# Altium footprint library common.PcbLib: 552 footprints (part 25 of 35)
Each footprint in its own frame and in the unit in brackets; x right, y up, seen from the top. Pads: shape width x height; smd on the part's side, far side on the other; paste and mask are expansions set on the pad; w line width, h text height; cw(c..) or ccw(c..) is an arc to the next point about the centre after c.
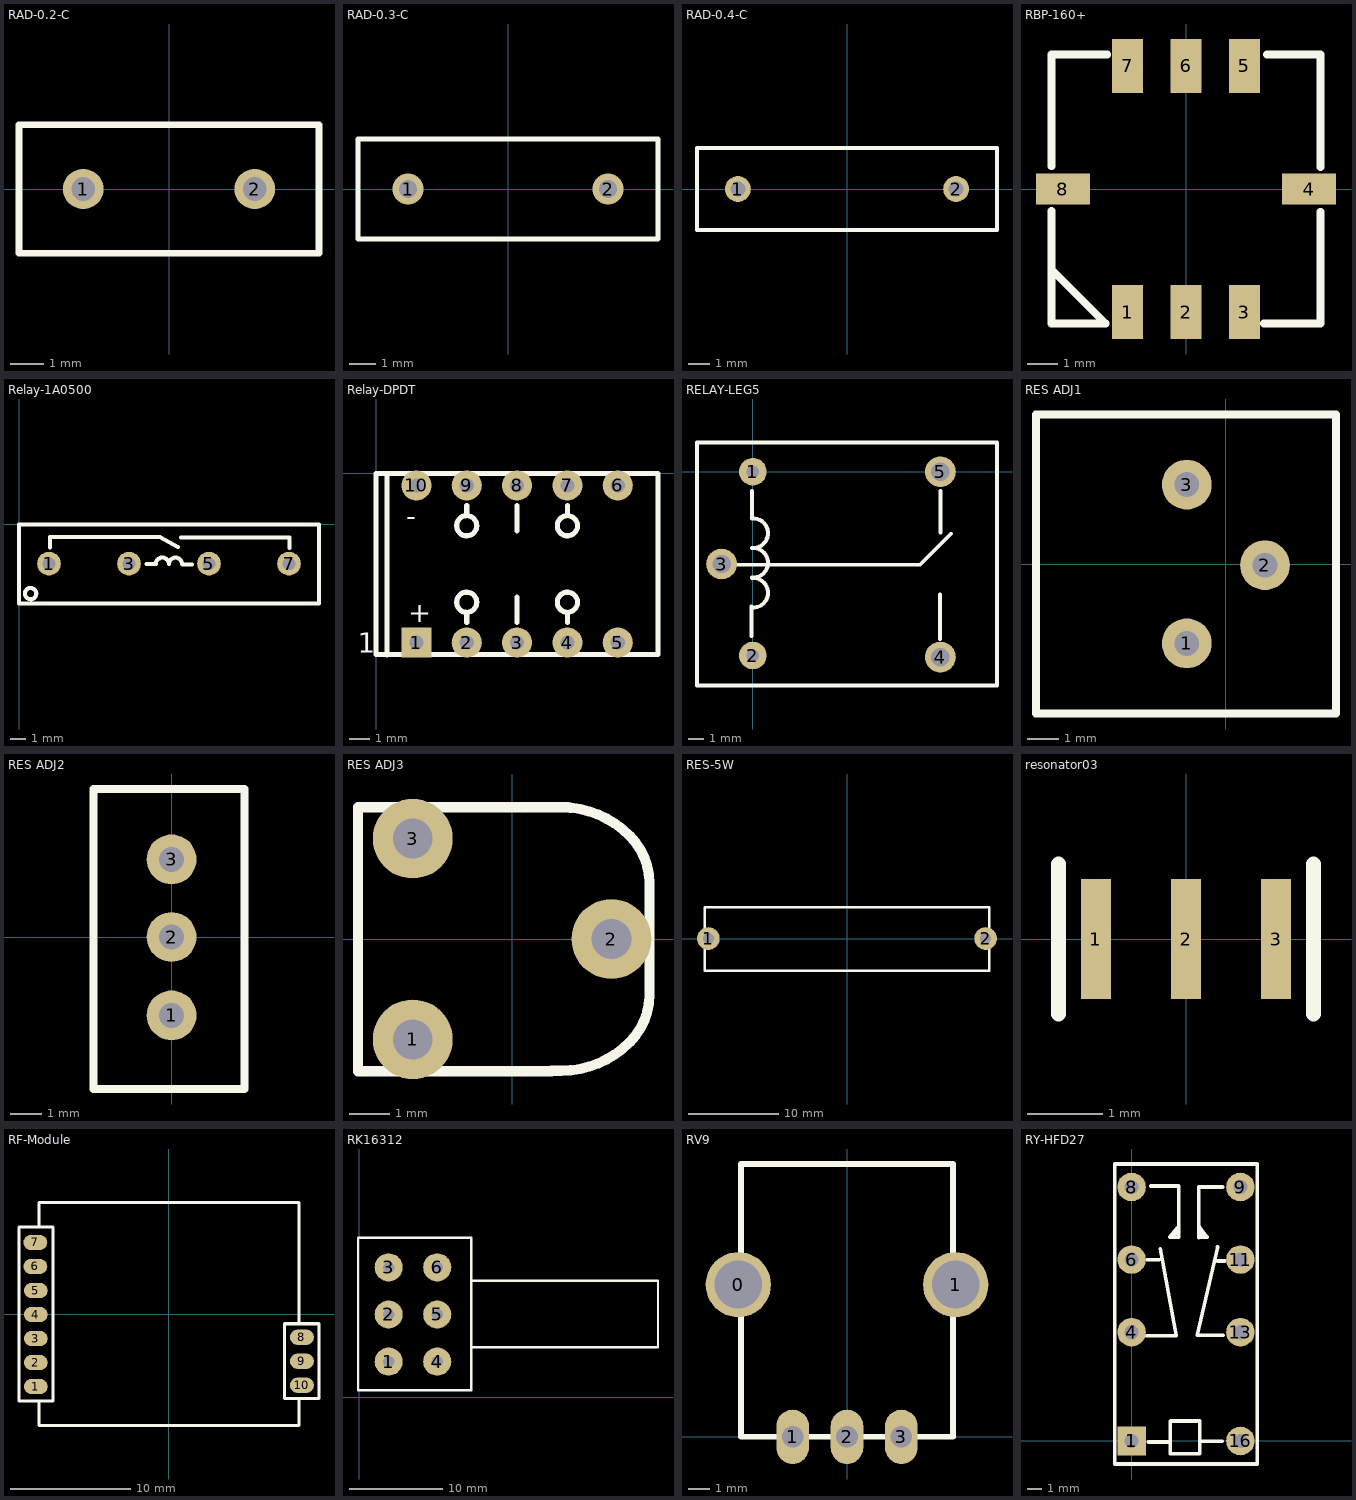
[diagram p24: the footprints below, top view; thin cyan lines are the x and y axes]

## RAD-0.2-C [mm] "Radial Cap, Thru-Hole; 2 Leads; 0.2 in Pin Spacing"
pads (2):
  round 1.2 hole 0.7: 1(-2.54,0) 2(2.54,0)
Top Overlay:
  lines w0.2: -4.445,-1.905 -4.445,1.905 4.445,1.905 4.445,-1.905 -4.445,-1.905
3D body: height 6.14, standoff -1.48, extent -2.794,-1.016 2.794,1.27

## RAD-0.3-C [mm] "Radial Cap, Thru-Hole; 2 Leads; 0.3 in Pin Spacing"
height 6
pads (2):
  round 1.2 hole 0.7: 1(-3.81,0) 2(3.81,0)
Top Overlay:
  lines w0.2: -5.715,-1.905 5.715,-1.905 5.715,1.905 -5.715,1.905 -5.715,-1.905
3D body: height 14.62, standoff -5.79, extent -6.377,-2.921 6.123,2.979

## RAD-0.4-C [mm] "Radial Cap, Thru-Hole; 2 Leads; 0.4 in Pin Spacing"
pads (2):
  round 1.2 hole 0.7: 1(-5.08,0) 2(5.08,0)
Top Overlay:
  lines w0.2: -6.985,-1.905 6.985,-1.905 6.985,1.905 -6.985,1.905 -6.985,-1.905
3D body: height 16.47, standoff -3.94, extent -6.25,-2.979 6.25,2.921

## RBP-160+ [mm] "IF SAW FILTER"
height 5.33
pads (8):
  rect 1.02x1.78 smd: 1(-1.93,-4.065) 2(0,-4.065) 3(1.93,-4.065) 5(1.93,4.065) 6(0,4.065) 7(-1.93,4.065)
  rect 1.78x1.02 smd: 4(4.065,0) 8(-4.065,0)
Top Overlay:
  lines w0.254: -4.445,-4.191 -4.445,-0.725 ; -4.445,-3.275 -4.445,-4.445 -2.65,-4.445 -4.445,-2.65 -4.445,-2.325 ; -4.445,0.75 -4.445,4.445 -2.6,4.445 ; 2.575,-4.445 4.445,-4.445 4.445,-0.75 ; 2.675,4.445 4.191,4.445 4.445,4.445 ; 3.35,4.445 4.445,4.445 ; 4.445,0.725 4.445,4.445
3D body: height 2.54, standoff 0, extent -4.455,-4.455 4.455,4.455

## Relay-1A0500 [mm]
pads (4):
  round 1.5 hole 0.8: 1(1.905,-2.489) 3(6.985,-2.489) 5(12.065,-2.489) 7(17.145,-2.489)
Top Overlay:
  circle w0.254: c0.737,-4.394 r0.359
  lines w0.254: 1.981,-1.473 1.981,-0.813 8.966,-0.813 10.109,-1.448 ; 8.103,-2.515 8.687,-2.515 cw(c9.093,-2.515) 9.093,-2.108 cw(c9.093,-2.54) 9.524,-2.516 ; 9.526,-2.515 cw(c9.932,-2.515) 9.932,-2.108 cw(c9.932,-2.54) 10.363,-2.516 ; 10.287,-0.838 17.17,-0.838 17.17,-1.499 ; 10.389,-2.54 10.973,-2.54 ; 0,-5.029 19.05,-5.029 19.05,0 0,0 0,-5.029
3D body: height 8.15, standoff -3.15, extent -0.374,-5.054 19.426,0.026

## Relay-DPDT [mm]
pads (10):
  rect 1.5x1.5 hole 0.7: 1(2,-8.4)
  round 1.5 hole 0.7: 2(4.5,-8.4) 3(7,-8.4) 4(9.5,-8.4) 5(12,-8.4) 6(12,-0.6) 7(9.5,-0.6) 8(7,-0.6) 9(4.5,-0.6) 10(2,-0.6)
Top Overlay:
  circle w0.254: c4.5,-2.6 r0.5
  circle w0.254: c9.5,-2.6 r0.5
  circle w0.254: c4.5,-6.4 r0.5
  circle w0.254: c9.5,-6.4 r0.5
  lines w0.254: 0.533,-9.017 0.533,-0.025 ; 4.5,-7.4 4.5,-6.9 ; 4.5,-2.1 4.5,-1.6 ; 7,-7.4 7,-6.15 ; 7,-2.85 7,-1.6 ; 9.5,-7.4 9.5,-6.9 ; 9.5,-2.1 9.5,-1.6 ; 0,-9 0,0 14,0 14,-9 0,-9
  text "+" at 1.6,-7.4 h1
  text "-" at 1.5,-2.6 h1
  text "1" at -0.9,-8.9 h1
3D body: height 5, standoff 0, extent 0,-9 14,0

## RELAY-LEG5 [mm]
pads (5):
  round 1.8 hole 0.8: 1(0,0) 2(0,-11.965)
  round 2 hole 1.2: 3(-2.032,-6.007) 4(12.217,-12.065) 5(12.217,0)
Top Overlay:
  lines w0.254: -0.965,-6.058 10.897,-6.058 12.916,-4.039 ; -0.076,-10.706 -0.076,-8.776 ; -0.051,-8.852 ccw(c0.021,-7.887) -0.04,-6.922 ; -0.051,-6.896 ccw(c0.021,-5.932) -0.04,-4.966 ; -0.051,-4.966 ccw(c0.021,-4.001) -0.04,-3.036 -0.04,-1.243 ; 12.192,-10.884 12.192,-7.988 ; 12.217,-3.95 12.217,-1.257 ; -3.632,-13.919 15.9,-13.919 15.9,1.905 -3.632,1.905 -3.632,-13.919
3D body: height 15.3, standoff -5, extent -3.403,-13.906 15.697,1.594

## RES ADJ1 [mm]
pads (3):
  round 1.6 hole 0.8: 1(-1.257,-2.553) 2(1.257,-0.038) 3(-1.257,2.553)
Top Overlay:
  lines w0.254: -6.109,-4.813 -6.109,4.813 3.543,4.813 3.543,-4.813 -6.109,-4.813
3D body: height 5, standoff -4.83, extent -6.073,-4.793 3.457,4.737

## RES ADJ2 [mm]
pads (3):
  round 1.6 hole 0.8: 1(0,-2.515) 2(0,0) 3(0,2.489)
Top Overlay:
  lines w0.254: -2.502,-4.877 -2.502,4.75 2.337,4.75 2.337,-4.877 -2.502,-4.877
3D body: height 9.53, standoff -5, extent -2.464,-4.828 2.366,4.701

## RES ADJ3 [mm]
pads (3):
  round 2 hole 1: 1(-2.489,-2.515) 2(2.489,0) 3(-2.489,2.515)
Top Overlay:
  lines w0.254: 0.991,-3.315 -3.861,-3.315 -3.861,3.302 1.397,3.302 ; 0.991,-3.302 1.229,-3.302 ccw(c1.229,-0.874) 2.946,-2.591 ccw(c1.751,-1.395) 3.442,-1.395 3.442,-1.372 ; 0.991,3.302 1.229,3.302 cw(c1.229,0.874) 2.946,2.591 cw(c1.751,1.395) 3.442,1.395 3.442,1.372 ; 3.442,-1.384 3.442,1.384
3D body: height 7.5, standoff -2, extent -3.754,-3.201 3.246,3.199

## RES-5W [mm]
pads (2):
  round 2.5 hole 1.2: 1(-15.291,0) 2(15.291,0)
Top Overlay:
  lines w0.254: -15.697,-3.556 -15.697,3.454 15.697,3.454 15.697,-3.556 -15.697,-3.556
3D body: height 4.35, standoff -6.85, extent -15.64,-3.52 15.64,3.48

## resonator03 [mm]
height 1.35
pads (3):
  rect 0.4x1.6 smd: 1(-1.2,0) 2(0,0) 3(1.2,0)
Top Overlay:
  lines w0.203: -1.7,-1 -1.7,1 ; 1.7,-1 1.7,1
3D body: height 1.02, standoff -0.09, extent -1.6,-0.6 1.6,0.7

## RF-Module [mm]
pads (10):
  oval 2x1.27 smd: 1(-11.067,-6.005) 2(-11.067,-4.005) 3(-11.067,-2.005) 4(-11.067,-0.004) 5(-11.067,1.996) 6(-11.107,4.005) 7(-11.107,6.005) 8(11.107,-1.897) 9(11.107,-3.897) 10(11.107,-5.897)
Top Overlay:
  lines w0.254: -10.813,-7.326 -10.813,-9.231 10.853,-9.231 10.853,-7.097 ; -10.813,7.304 -10.813,9.311 10.853,9.311 10.853,-0.798 ; -12.464,-7.205 -12.464,7.295 -9.645,7.295 -9.645,-7.205 -12.464,-7.205 ; 9.659,-6.997 12.529,-6.997 12.53,-0.773 9.659,-0.773 9.659,-6.997
3D body: height 1.9, standoff -0.07, extent -10.846,-9.169 10.82,9.373

## RK16312 [mm]
pads (6):
  round 3 hole 1.2: 1(3.15,3.81) 2(3.15,8.839) 3(3.15,13.868) 4(8.331,3.81) 5(8.331,8.839) 6(8.331,13.868)
Top Overlay:
  lines w0.254: 11.963,12.421 31.902,12.421 31.902,5.334 11.989,5.334 ; -0.127,0.762 11.963,0.762 11.963,17.018 -0.127,17.018 -0.127,0.762
3D body: height 20.62, standoff -4, extent -0.124,-0.035 31.976,17.065

## RV9 [mm]
pads (5):
  round 3 hole 2.2: 0(-5,7) 1(5,7)
  oval 1.5x2.5 hole 1: 1(-2.5,0) 2(0,0) 3(2.5,0)
Top Overlay:
  lines w0.254: -4.876,0 -4.876,12.55 4.876,12.55 4.876,0 -4.876,0
3D body: height 20, standoff -3.8, extent -4.876,0 4.876,12.55

## RY-HFD27 [mm]
pads (8):
  rect 2x2 hole 1: 1(0,0)
  round 2 hole 1: 4(0,7.62) 6(0,12.7) 8(0,17.78) 9(7.62,17.78) 11(7.62,12.7) 13(7.62,7.62) 16(7.62,0)
Top Overlay:
  lines w0.254: 1.022,7.375 3.128,7.375 2.004,13.46 ; 1.058,12.693 1.932,12.693 ; 1.183,-0.066 2.629,-0.066 ; 1.344,17.85 3.307,17.85 3.306,14.263 2.664,14.263 3.217,14.923 3.021,14.406 ; 4.734,15.013 5.287,14.281 5.269,14.263 4.698,14.245 4.699,17.779 6.394,17.779 ; 4.805,14.781 4.966,14.352 ; 4.877,-0.013 6.34,-0.013 ; 6.001,12.604 6.519,12.604 ; 6.019,13.585 4.609,7.411 6.429,7.411 ; -1.19,-1.61 8.81,-1.61 8.81,19.39 -1.19,19.39 -1.19,-1.61 ; 2.7,-0.887 2.7,1.076 2.7,1.361 2.736,1.397 4.77,1.397 4.77,-0.869 4.752,-0.887 2.7,-0.887
3D body: height 10.92, standoff -4, extent -1.143,-1.27 8.857,19.13